# Altium footprint library PcbLib.PcbLib: 108 footprints (part 3 of 7)
Each footprint in its own frame and in the unit in brackets; x right, y up, seen from the top. Pads: shape width x height; smd on the part's side, far side on the other; paste and mask are expansions set on the pad; w line width, h text height; cw(c..) or ccw(c..) is an arc to the next point about the centre after c.
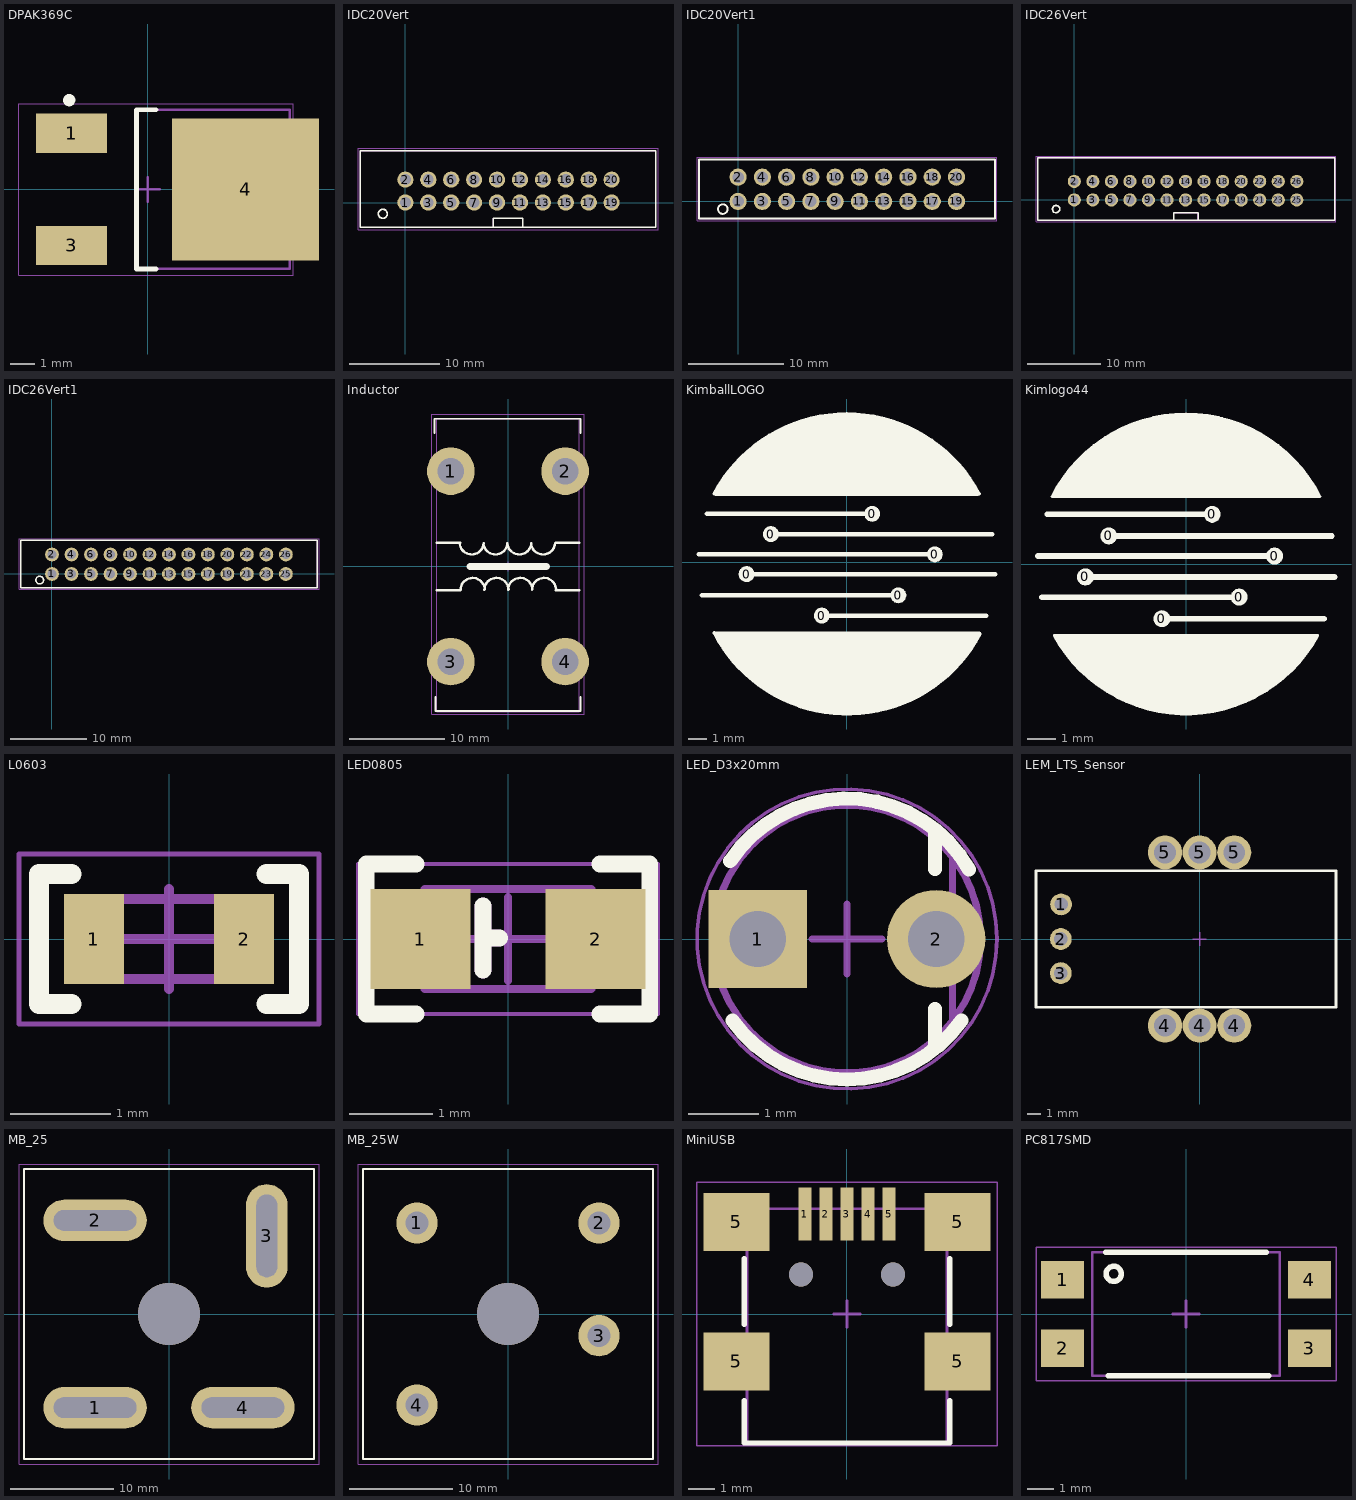
[diagram p2: the footprints below, top view; thin cyan lines are the x and y axes]

## DPAK369C [mm] "D-PAK, 3-Pads, Body 6,10x6,61mm (max), IPC Medium Density"
height 2.2
pads (3):
  rect 2.9x1.6 smd: 1(-3.1,2.29) 3(-3.1,-2.29)
  rect 6x5.8 smd: 4(4,0)
Top Overlay:
  circle w0.25: c-3.2,3.64 r0.125
  lines w0.2: 0.35,-3.25 -0.45,-3.25 -0.45,3.25 0.35,3.25
Mechanical 13:
  lines w0.05: -5.25,-3.5 5.95,-3.5 5.95,3.5 -5.25,3.5 -5.25,-3.5
  lines w0.1: -0.5,0 0.5,0 ; 0,-0.5 0,0.5
Mechanical 14:
  lines w0.1: -0.45,-3.25 -0.45,3.25 ; -0.2,-3.25 5.8,-3.25 5.8,3.25 -0.2,3.25
3D body "DPAK369C.step": height 2.2, standoff 0, extent -3.71,-3.25 6.195,3.25

## IDC20Vert [mm]
height 10
pads (20):
  round 1.8 hole 1.2: 1(0,0) 2(0,2.54) 3(2.54,0) 4(2.54,2.54) 5(5.08,0) 6(5.08,2.54) 7(7.62,0) 8(7.62,2.54) 9(10.16,0) 10(10.16,2.54) 11(12.7,0) 12(12.7,2.54) 13(15.24,0) 14(15.24,2.54) 15(17.78,0) 16(17.78,2.54) 17(20.32,0) 18(20.32,2.54) 19(22.86,0) 20(22.86,2.54)
Top Overlay:
  circle w0.2: c-2.5,-1.25 r0.5
  lines w0.2: 9.75,-2.75 9.75,-1.75 13,-1.75 13,-2.75 ; -5,-2.75 -5,5.75 27.75,5.75 27.75,-2.75 -5,-2.75
Mechanical 13:
  lines w0.05: -5.25,-3 28,-3 28,6 -5.25,6 -5.25,-3
Mechanical 14:
  lines w0.1: -5,-2.75 27.75,-2.75 27.75,5.75 -5,5.75 -5,-2.75 ; 9.75,-2.75 13,-2.75 13,-1.75 9.75,-1.75 9.75,-2.75
3D body "User Library-idc-20_asm.STEP": height 9, standoff -3.2, extent -4.95,-2.8 27.75,5.7

## IDC20Vert1 [mm]
height 10
pads (20):
  round 1.8 hole 1.2: 1(0,0) 2(0,2.54) 3(2.54,0) 4(2.54,2.54) 5(5.08,0) 6(5.08,2.54) 7(7.62,0) 8(7.62,2.54) 9(10.16,0) 10(10.16,2.54) 11(12.7,0) 12(12.7,2.54) 13(15.24,0) 14(15.24,2.54) 15(17.78,0) 16(17.78,2.54) 17(20.32,0) 18(20.32,2.54) 19(22.86,0) 20(22.86,2.54)
Top Overlay:
  circle w0.2: c-1.6,-0.8 r0.5
  lines w0.2: -4.1,-1.8 26.9,-1.8 26.9,4.4 -4.1,4.4 -4.1,-1.8
Mechanical 13:
  lines w0.05: -4.3,-2 -4.3,4.6 27.1,4.6 27.1,-2 -4.3,-2
Mechanical 14:
  lines w0.1: -4.1,-1.8 -4.1,4.4 26.9,4.4 26.9,-1.8 -4.1,-1.8
3D body "connector_awlp20_3_2t.stp": height 15.1, standoff -3.2, extent -4,-1.7 26.8,4.3

## IDC26Vert [mm]
height 10
pads (26):
  round 1.8 hole 1.2: 1(0,0) 2(0,2.54) 3(2.54,0) 4(2.54,2.54) 5(5.08,0) 6(5.08,2.54) 7(7.62,0) 8(7.62,2.54) 9(10.16,0) 10(10.16,2.54) 11(12.7,0) 12(12.7,2.54) 13(15.24,0) 14(15.24,2.54) 15(17.78,0) 16(17.78,2.54) 17(20.32,0) 18(20.32,2.54) 19(22.86,0) 20(22.86,2.54) 21(25.4,0) 22(25.4,2.54) 23(27.94,0) 24(27.94,2.54) 25(30.48,0) 26(30.48,2.54)
Top Overlay:
  circle w0.2: c-2.5,-1.25 r0.5
  lines w0.2: 13.6,-2.75 13.6,-1.75 16.95,-1.75 16.95,-2.75 ; -5,-2.75 -5,5.75 35.675,5.75 35.675,-2.75 -5,-2.75
Mechanical 13:
  lines w0.05: -5.25,-3 35.85,-3 35.85,6 -5.25,6 -5.25,-3
Mechanical 14:
  lines w0.1: -5,-2.75 35.65,-2.75 35.65,5.75 -5,5.75 -5,-2.75 ; 13.625,-2.75 16.925,-2.75 16.925,-1.75 13.625,-1.75 13.625,-2.75
3D body "IDC26.step": height 9.33, standoff -3.07, extent -5.01,-2.975 35.61,5.875

## IDC26Vert1 [mm]
height 10
pads (26):
  round 1.8 hole 1.2: 1(0,0) 2(0,2.54) 3(2.54,0) 4(2.54,2.54) 5(5.08,0) 6(5.08,2.54) 7(7.62,0) 8(7.62,2.54) 9(10.16,0) 10(10.16,2.54) 11(12.7,0) 12(12.7,2.54) 13(15.24,0) 14(15.24,2.54) 15(17.78,0) 16(17.78,2.54) 17(20.32,0) 18(20.32,2.54) 19(22.86,0) 20(22.86,2.54) 21(25.4,0) 22(25.4,2.54) 23(27.94,0) 24(27.94,2.54) 25(30.48,0) 26(30.48,2.54)
Top Overlay:
  circle w0.2: c-1.6,-0.8 r0.5
  lines w0.2: -4.1,-1.8 34.6,-1.8 34.6,4.4 -4.1,4.4 -4.1,-1.8
Mechanical 13:
  lines w0.05: -4.3,-2 -4.3,4.6 34.8,4.6 34.8,-2 -4.3,-2
Mechanical 14:
  lines w0.1: -4.1,-1.8 -4.1,4.4 34.6,4.4 34.6,-1.8 -4.1,-1.8
3D body "connector_awlp26_3_2t.stp": height 15.1, standoff -3.2, extent -3.92,-1.7 34.5,4.3

## Inductor [mm] "Common Mode Inductor"
height 30
pads (4):
  round 5 hole 2.8: 1(-6,10) 2(6,10) 3(-6,-10) 4(6,-10)
Top Overlay:
  lines w0.2: -7.7,14 -7.7,15.5 7.6,15.5 7.6,14 ; -7.6,-13.7 -7.6,-15.2 7.6,-15.2 7.6,-13.7
  lines w0.254: -7.498,-2.5 -5,-2.5 ; -7.498,2.487 -5,2.487 ; -5.069,2.406 ccw(c-3.814,2.509) -2.557,2.449 ; -4.977,-2.458 cw(c-3.709,-2.479) -2.441,-2.417 ; -2.57,2.406 ccw(c-1.316,2.509) -0.059,2.449 ; 0.019,-2.458 cw(c1.288,-2.479) 2.556,-2.419 ; 2.426,2.406 ccw(c3.68,2.509) 4.938,2.449 ; 2.517,-2.458 cw(c3.786,-2.479) 5.054,-2.419 ; 4.993,-2.5 7.491,-2.5 ; 4.993,2.487 7.491,2.487 ; -2.479,-2.458 cw(c-1.21,-2.479) 0.057,-2.419 ccw(c-1.21,-2.479) -2.479,-2.458 ; -0.072,2.406 ccw(c1.182,2.509) 2.439,2.449 cw(c1.182,2.509) -0.072,2.406
  lines w0.762: -3.984,-0.006 4.019,-0.006
Mechanical 13:
  lines w0.05: -8,-15.5 8,-15.5 8,16 -8,16 -8,-15.5
  lines w0.1: -0.5,0 0.5,0 ; 0,-0.5 0,0.5
Mechanical 14:
  lines w0.1: -7.5,-15.25 7.5,-15.25 7.5,15.5 -7.5,15.5 -7.5,-15.25
3D body "Triad Magnetics-CMT-8104.step": height 30.57, standoff -3.74, extent -7.64,-15.1 7.6,15.38

## KimballLOGO [mm]
pads (6):
  round 0.889 on Top Overlay: 0(-5.575,-0.65) 0(-4.225,1.575) 0(-1.4,-2.95) 0(1.4,2.7) 0(2.85,-1.825) 0(4.875,0.45)
Top Overlay:
  region: 7.36,-3.852 7.175,-4.3 6.958,-4.825 5.025,-6.8 4.9,-6.8 4.9,-6.825 4.55,-7.175 4.3,-7.175 4.025,-7.45 3.825,-7.45 3.625,-7.65 3.4,-7.65 3.2,-7.85 2.925,-7.85 2.75,-8.025 2.45,-8.025 2.325,-8.15 2.025,-8.15 1.925,-8.25 1.25,-8.25 1.125,-8.375 -1.175,-8.375 -1.3,-8.25 -1.875,-8.25 -2.025,-8.1 -2.375,-8.1 -2.475,-8 -2.75,-8 -2.925,-7.825 -3.225,-7.825 -3.475,-7.575 -3.75,-7.575 -4.05,-7.275 -4.225,-7.275 -4.475,-7.025 -4.65,-7.025 -5.05,-6.625 -5.225,-6.625 -6.35,-5.5 -6.35,-5.375 -6.9,-4.825 -6.9,-4.575 -7.25,-4.225 -7.25,-3.999 -7.397,-3.852
  region: -7.299,3.824 -7.175,4.125 -6.958,4.65 -5.025,6.625 -4.9,6.625 -4.9,6.65 -4.55,7 -4.3,7 -4.025,7.275 -3.825,7.275 -3.625,7.475 -3.4,7.475 -3.2,7.675 -2.925,7.675 -2.75,7.85 -2.45,7.85 -2.325,7.975 -2.025,7.975 -1.925,8.075 -1.25,8.075 -1.125,8.2 1.175,8.2 1.3,8.075 1.875,8.075 2.025,7.925 2.375,7.925 2.475,7.825 2.75,7.825 2.925,7.65 3.225,7.65 3.475,7.4 3.75,7.4 4.05,7.1 4.225,7.1 4.475,6.85 4.65,6.85 5.05,6.45 5.225,6.45 6.35,5.325 6.35,5.2 6.9,4.65 6.9,4.4 7.25,4.05 7.25,3.824
  lines w0.2: -7.368,3.81 cw(c-0.02,-0.068) 7.332,3.804 ; -7.363,-3.919 ccw(c0.02,-0.107) 7.378,-3.966
  lines w0.254: -8.225,0.45 4.875,0.45 ; -8.05,-1.825 2.85,-1.825 ; -7.775,2.7 1.5,2.7 ; -7.299,3.827 7.25,3.827 ; -7.275,-3.952 7.35,-3.952 ; -5.575,-0.65 8.225,-0.65 ; -4.25,1.575 8.075,1.575 ; -1.4,-2.95 7.725,-2.95

## Kimlogo44 [mm]
pads (6):
  round 0.6 on Top Overlay: 0(-3.55,-0.457) 0(-2.725,0.991) 0(-0.85,-1.93) 0(0.925,1.753) 0(1.875,-1.168) 0(3.125,0.279)
Top Overlay:
  region: 4.663,-2.487 4.425,-2.875 4.25,-3.2 3.175,-4.275 3.1,-4.275 2.875,-4.5 2.725,-4.5 2.575,-4.65 2.5,-4.65 2.4,-4.75 2.275,-4.75 2.15,-4.875 2.075,-4.875 2.025,-4.925 1.875,-4.925 1.775,-5.025 1.575,-5.025 1.475,-5.125 1.25,-5.125 1.175,-5.2 0.9,-5.2 0.85,-5.25 -0.875,-5.25 -0.95,-5.175 -1.3,-5.175 -1.4,-5.075 -1.65,-5.075 -1.775,-4.95 -1.975,-4.95 -2.1,-4.825 -2.2,-4.825 -2.275,-4.75 -2.375,-4.75 -2.45,-4.675 -2.525,-4.675 -2.625,-4.575 -2.7,-4.575 -2.825,-4.45 -2.925,-4.45 -3.1,-4.275 -3.15,-4.275 -3.4,-4.025 -3.45,-4.025 -3.8,-3.675 -3.8,-3.65 -4.175,-3.275 -4.175,-3.225 -4.4,-3 -4.4,-2.95 -4.475,-2.875 -4.475,-2.775 -4.625,-2.625 -4.625,-2.487
  region: -4.724,2.388 -4.425,2.875 -4.25,3.2 -3.175,4.275 -3.1,4.275 -2.875,4.5 -2.725,4.5 -2.575,4.65 -2.5,4.65 -2.4,4.75 -2.275,4.75 -2.15,4.875 -2.075,4.875 -2.025,4.925 -1.875,4.925 -1.775,5.025 -1.575,5.025 -1.475,5.125 -1.25,5.125 -1.175,5.2 -0.9,5.2 -0.85,5.25 0.875,5.25 0.95,5.175 1.3,5.175 1.4,5.075 1.65,5.075 1.775,4.95 1.975,4.95 2.1,4.825 2.2,4.825 2.275,4.75 2.375,4.75 2.45,4.675 2.525,4.675 2.625,4.575 2.7,4.575 2.825,4.45 2.925,4.45 3.1,4.275 3.15,4.275 3.4,4.025 3.45,4.025 3.8,3.675 3.8,3.65 4.175,3.275 4.175,3.225 4.4,3 4.4,2.95 4.475,2.875 4.475,2.775 4.625,2.625 4.625,2.487 4.725,2.387
  lines w0.1: -4.652,-2.526 ccw(c0,0) 4.652,-2.526 ; -4.724,2.388 cw(c0,0) 4.725,2.387 -4.724,2.388
  lines w0.2: -5.221,0.279 3.125,0.279 ; -5.082,-1.168 1.875,-1.168 ; -4.897,1.753 0.925,1.753 ; -3.55,-0.457 5.243,-0.457 ; -2.725,0.991 5.141,0.991 ; -0.85,-1.93 4.87,-1.93

## L0603 [mm]
height 0.45
pads (2):
  rect 0.6x0.9 smd: 1(-0.75,0) 2(0.75,0)
Top Overlay:
  lines w0.2: -0.975,-0.65 -1.3,-0.65 -1.3,0.65 -0.975,0.65 ; 0.975,-0.65 1.3,-0.65 1.3,0.65 0.975,0.65
Mechanical 13:
  lines w0.05: -1.5,-0.85 1.5,-0.85 1.5,0.85 -1.5,0.85 -1.5,-0.85
  lines w0.1: -0.5,0 0.5,0 ; 0,-0.5 0,0.5
Mechanical 14:
  lines w0.1: -0.8,-0.4 0.7,-0.4 0.7,0.4 -0.8,0.4 -0.8,-0.4
3D body "L0603-1608.STEP": height 0.8, standoff 0, extent -0.8,-0.4 0.8,0.4

## LED0805 [mm]
height 0.7
pads (2):
  rect 1.2x1.2 smd: 1(-1.05,0) 2(1.05,0)
Top Overlay:
  lines w0.2: -1.1,-0.9 -1.7,-0.9 -1.7,0.9 -1.1,0.9 ; -0.3,-0.375 -0.3,0.4 ; -0.3,0.012 -0.1,0.012 ; 1.1,-0.9 1.7,-0.9 1.7,0.9 1.1,0.9
Mechanical 13:
  lines w0.05: -1.8,-0.9 1.8,-0.9 1.8,0.9 -1.8,0.9 -1.8,-0.9
  lines w0.1: -0.5,0 0.5,0 ; 0,-0.5 0,0.5
Mechanical 14:
  lines w0.1: -1,-0.6 1,-0.6 1,0.6 -1,0.6 -1,-0.6
  lines w0.2: -0.3,-0.375 -0.3,0.4 ; -0.3,0.012 -0.112,0.012
3D body "LED0805.step": height 0.64, standoff 0, extent -1,-0.625 1,0.625

## LED_D3x20mm [mm]
height 20
pads (2):
  rect 1.4x1.4 hole 0.8: 1(-1.27,0)
  round 1.4 hole 0.8: 2(1.27,0)
Top Overlay:
  lines w0.2: -1.664,1.109 cw(c0,0) 1.736,0.992 ; -1.627,-1.162 ccw(c0,0) 1.627,-1.162 ; 1.25,-1.5 1.25,-1 ; 1.25,1 1.25,1.5
Mechanical 13:
  circle w0.05: c0,0 r2.136
  lines w0.1: -0.5,0 0.5,0 ; 0,-0.5 0,0.5
Mechanical 14:
  circle w0.1: c0,0 r1.904
  lines w0.1: 1.5,-1.25 1.5,1.25
3D body "LED RED 3mm.step": height 8.8, standoff -1.5, extent -1.9,-1.899 1.6,1.9

## LEM_LTS_Sensor [mm]
height 24
pads (9):
  round 1.6 hole 1: 1(-10.16,2.54) 2(-10.18,0) 3(-10.18,-2.5)
  round 2.5 hole 1.6: 4(-2.54,-6.35) 4(0,-6.35) 4(2.54,-6.35) 5(-2.54,6.35) 5(0,6.35) 5(2.54,6.35)
Top Overlay:
  lines w0.2: -12,-5 10,-5 10,5 4,5 -3.5,5 -12,5 -12,-5
Mechanical 13:
  lines w0.1: -0.5,0 0.5,0 ; 0,-0.5 0,0.5
3D body "LEMSensor.STEP": height 24.1, standoff -2.7, extent -12.125,-6.7 10.125,6.8

## MB_25 [mm] "DIODE BRIDGE"
height 12
pads (4):
  oval 10x4 hole 2 slot 8 at 0 deg: 1(-7.15,-9.05) 2(-7.15,9.05) 4(7.15,-9.05)
  oval 4x10 hole 2 slot 8 at 90 deg: 3(9.45,7.55)
via 0,0 diameter 6 hole 6
Top Overlay:
  lines w0.2: -14,-14 14,-14 14,14 -14,14 -14,-14
Mechanical 13:
  lines w0.05: -14.5,-14.5 14.5,-14.5 14.5,14.5 -14.5,14.5 -14.5,-14.5
  lines w0.1: -0.5,0 0.5,0 ; 0,-0.5 0,0.5
Mechanical 14:
  lines w0.1: -14,-14 -14,14 14,14 14,-14 -14,-14
3D body "Silicon Bridge .step": height 10.5, standoff -11.5, extent -14,-14 14,14

## MB_25W [mm] "DIODE BRIDGE"
height 12
pads (4):
  round 4 hole 2.2: 1(-8.8,8.8) 2(8.8,8.8) 3(8.8,-2.1) 4(-8.8,-8.8)
via 0,0 diameter 6 hole 6
Top Overlay:
  lines w0.2: -14,-14 -14,14 14,14 14,-14 -14,-14
Mechanical 13:
  lines w0.05: -14.5,-14.5 -14.5,14.5 14.5,14.5 14.5,-14.5 -14.5,-14.5
  lines w0.1: -0.5,0 0.5,0 ; 0,-0.5 0,0.5
Mechanical 14:
  lines w0.1: -14,-14 14,-14 14,14 -14,14 -14,-14
3D body "BD5010W.STEP": height 13.5, standoff -2.5, extent -14,-14 14.01,14

## MiniUSB [mm]
height 3.95
pads (9):
  rect 0.5x2 smd: 1(-1.6,3.8) 2(-0.8,3.8) 3(0,3.8) 4(0.8,3.8) 5(1.6,3.8)
  rect 2.5x2.2 smd: 5(-4.2,-1.8) 5(-4.2,3.5) 5(4.2,-1.8) 5(4.2,3.5)
via 1.75,1.5 diameter 0.9 hole 0.9
via -1.75,1.5 diameter 0.9 hole 0.9
Top Overlay:
  lines w0.2: -3.9,-3.3 -3.9,-4.9 3.9,-4.9 3.9,-3.3 ; -3.9,-0.4 -3.9,2.1 ; 3.9,-0.4 3.9,2.1
Mechanical 13:
  lines w0.05: -5.7,-5 5.7,-5 5.7,5 -5.7,5 -5.7,-5
  lines w0.1: -0.5,0 0.5,0 ; 0,-0.5 0,0.5
Mechanical 14:
  lines w0.1: -3.8,-4.9 -3.8,4 3.8,4 3.8,2.3 3.8,-4.9 -3.8,-4.9
3D body "User Library-UX60-MB-5ST.STEP": height 4.7, standoff -0.4, extent -4.95,-4.9 4.95,4.1

## PC817SMD [mm]
height 3.5
pads (4):
  rect 1.6x1.4 smd: 1(-4.61,1.27) 2(-4.61,-1.27) 3(4.61,-1.27) 4(4.61,1.27)
Top Overlay:
  circle w0.2: c-2.7,1.5 r0.283
  lines w0.2: -3,2.3 3,2.3 ; -2.9,-2.3 3.1,-2.3
Mechanical 13:
  lines w0.05: -5.6,-2.5 5.6,-2.5 5.6,2.5 -5.6,2.5 -5.6,-2.5
  lines w0.1: -0.5,0 0.5,0 ; 0,-0.5 0,0.5
Mechanical 14:
  circle w0.1: c-2.7,1.5 r0.3
  lines w0.1: -3.5,-2.3 -3.5,2.3 3.5,2.3 3.5,-2.3 -3.5,-2.3
3D body "User Library-PC817_Gullwing.STEP": height 3.9, standoff 0.05, extent -5,-2.29 5,2.29